# Altium footprint library Library.PcbLib: 292 footprints (part 2 of 20)
Each footprint in its own frame and in the unit in brackets; x right, y up, seen from the top. Pads: shape width x height; smd on the part's side, far side on the other; paste and mask are expansions set on the pad; w line width, h text height; cw(c..) or ccw(c..) is an arc to the next point about the centre after c.
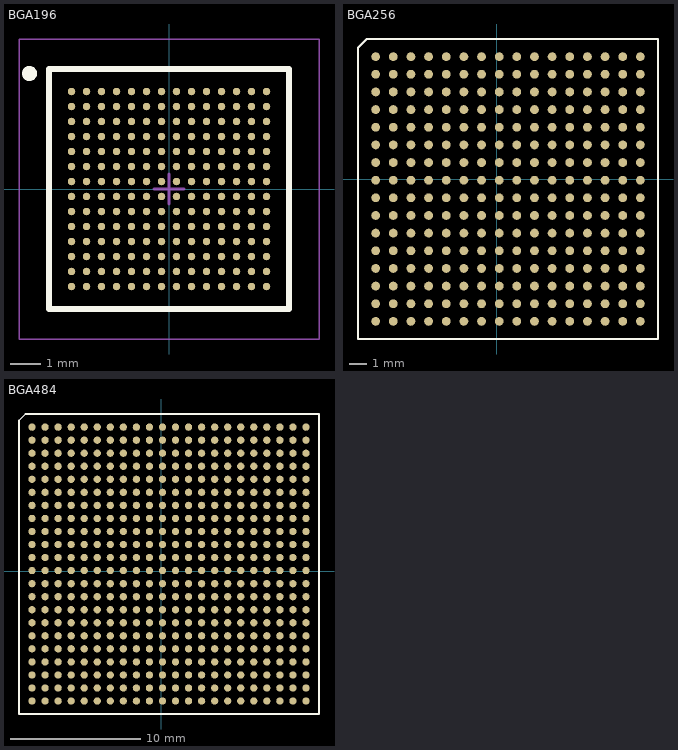
[diagram p1: the footprints below, top view; thin cyan lines are the x and y axes]

## BGA196 [mm] "BGA, 196-Leads, Body 8x8mm, Pitch 0.5mm"
height 1.1
pads (196):
  round 0.25 smd: A1(-3.25,3.25) A2(-2.75,3.25) A3(-2.25,3.25) A4(-1.75,3.25) A5(-1.25,3.25) A6(-0.75,3.25) A7(-0.25,3.25) A8(0.25,3.25) A9(0.75,3.25) A10(1.25,3.25) A11(1.75,3.25) A12(2.25,3.25) A13(2.75,3.25) A14(3.25,3.25) B1(-3.25,2.75) B2(-2.75,2.75) B3(-2.25,2.75) B4(-1.75,2.75) B5(-1.25,2.75) B6(-0.75,2.75) B7(-0.25,2.75) B8(0.25,2.75) B9(0.75,2.75) B10(1.25,2.75) B11(1.75,2.75) B12(2.25,2.75) B13(2.75,2.75) B14(3.25,2.75) C1(-3.25,2.25) C2(-2.75,2.25) C3(-2.25,2.25) C4(-1.75,2.25) C5(-1.25,2.25) C6(-0.75,2.25) C7(-0.25,2.25) C8(0.25,2.25) C9(0.75,2.25) C10(1.25,2.25) C11(1.75,2.25) C12(2.25,2.25) C13(2.75,2.25) C14(3.25,2.25) D1(-3.25,1.75) D2(-2.75,1.75) D3(-2.25,1.75) D4(-1.75,1.75) D5(-1.25,1.75) D6(-0.75,1.75) D7(-0.25,1.75) D8(0.25,1.75) D9(0.75,1.75) D10(1.25,1.75) D11(1.75,1.75) D12(2.25,1.75) D13(2.75,1.75) D14(3.25,1.75) E1(-3.25,1.25) E2(-2.75,1.25) E3(-2.25,1.25) E4(-1.75,1.25) E5(-1.25,1.25) E6(-0.75,1.25) E7(-0.25,1.25) E8(0.25,1.25) E9(0.75,1.25) E10(1.25,1.25) E11(1.75,1.25) E12(2.25,1.25) E13(2.75,1.25) E14(3.25,1.25) F1(-3.25,0.75) F2(-2.75,0.75) F3(-2.25,0.75) F4(-1.75,0.75) F5(-1.25,0.75) F6(-0.75,0.75) F7(-0.25,0.75) F8(0.25,0.75) F9(0.75,0.75) F10(1.25,0.75) F11(1.75,0.75) F12(2.25,0.75) F13(2.75,0.75) F14(3.25,0.75) G1(-3.25,0.25) G2(-2.75,0.25) G3(-2.25,0.25) G4(-1.75,0.25) G5(-1.25,0.25) G6(-0.75,0.25) G7(-0.25,0.25) G8(0.25,0.25) G9(0.75,0.25) G10(1.25,0.25) G11(1.75,0.25) G12(2.25,0.25) G13(2.75,0.25) G14(3.25,0.25) H1(-3.25,-0.25) H2(-2.75,-0.25) H3(-2.25,-0.25) H4(-1.75,-0.25) H5(-1.25,-0.25) H6(-0.75,-0.25) H7(-0.25,-0.25) H8(0.25,-0.25) H9(0.75,-0.25) H10(1.25,-0.25) H11(1.75,-0.25) H12(2.25,-0.25) H13(2.75,-0.25) H14(3.25,-0.25) J1(-3.25,-0.75) J2(-2.75,-0.75) J3(-2.25,-0.75) J4(-1.75,-0.75) J5(-1.25,-0.75) J6(-0.75,-0.75) J7(-0.25,-0.75) J8(0.25,-0.75) J9(0.75,-0.75) J10(1.25,-0.75) J11(1.75,-0.75) J12(2.25,-0.75) J13(2.75,-0.75) J14(3.25,-0.75) K1(-3.25,-1.25) K2(-2.75,-1.25) K3(-2.25,-1.25) K4(-1.75,-1.25) K5(-1.25,-1.25) K6(-0.75,-1.25) K7(-0.25,-1.25) K8(0.25,-1.25) K9(0.75,-1.25) K10(1.25,-1.25) K11(1.75,-1.25) K12(2.25,-1.25) K13(2.75,-1.25) K14(3.25,-1.25) L1(-3.25,-1.75) L2(-2.75,-1.75) L3(-2.25,-1.75) L4(-1.75,-1.75) L5(-1.25,-1.75) L6(-0.75,-1.75) L7(-0.25,-1.75) L8(0.25,-1.75) L9(0.75,-1.75) L10(1.25,-1.75) L11(1.75,-1.75) L12(2.25,-1.75) L13(2.75,-1.75) L14(3.25,-1.75) M1(-3.25,-2.25) M2(-2.75,-2.25) M3(-2.25,-2.25) M4(-1.75,-2.25) M5(-1.25,-2.25) M6(-0.75,-2.25) M7(-0.25,-2.25) M8(0.25,-2.25) M9(0.75,-2.25) M10(1.25,-2.25) M11(1.75,-2.25) M12(2.25,-2.25) M13(2.75,-2.25) M14(3.25,-2.25) N1(-3.25,-2.75) N2(-2.75,-2.75) N3(-2.25,-2.75) N4(-1.75,-2.75) N5(-1.25,-2.75) N6(-0.75,-2.75) N7(-0.25,-2.75) N8(0.25,-2.75) N9(0.75,-2.75) N10(1.25,-2.75) N11(1.75,-2.75) N12(2.25,-2.75) N13(2.75,-2.75) N14(3.25,-2.75) P1(-3.25,-3.25) P2(-2.75,-3.25) P3(-2.25,-3.25) P4(-1.75,-3.25) P5(-1.25,-3.25) P6(-0.75,-3.25) P7(-0.25,-3.25) P8(0.25,-3.25) P9(0.75,-3.25) P10(1.25,-3.25) P11(1.75,-3.25) P12(2.25,-3.25) P13(2.75,-3.25) P14(3.25,-3.25)
Top Overlay:
  circle w0.25: c-4.65,3.85 r0.125
  lines w0.2: -4,-4 4,-4 4,4 -4,4 -4,-4
Mechanical 13:
  lines w0.1: -4,-4 4,-4 4,4 -4,4 -4,-4
Mechanical 15:
  lines w0.05: -5,-5 5,-5 5,5 -5,5 -5,-5
  lines w0.1: -0.5,0 0.5,0 ; 0,-0.5 0,0.5
3D body "BGA196C50P14X14_800X800X150.step": height 1.5, standoff 0, extent -4,-4 4,4

## BGA256 [mm]
pads (256):
  round 0.5 smd: A1(-6.857,6.936) A2(-5.857,6.936) A3(-4.857,6.936) A4(-3.857,6.936) A5(-2.857,6.936) A6(-1.857,6.936) A7(-0.857,6.936) A8(0.143,6.936) A9(1.143,6.936) A10(2.143,6.936) A11(3.143,6.936) A12(4.143,6.936) A13(5.143,6.936) A14(6.143,6.936) A15(7.143,6.936) A16(8.143,6.936) B1(-6.857,5.936) B2(-5.857,5.936) B3(-4.857,5.936) B4(-3.857,5.936) B5(-2.857,5.936) B6(-1.857,5.936) B7(-0.857,5.936) B8(0.143,5.936) B9(1.143,5.936) B10(2.143,5.936) B11(3.143,5.936) B12(4.143,5.936) B13(5.143,5.936) B14(6.143,5.936) B15(7.143,5.936) B16(8.143,5.936) C1(-6.857,4.936) C2(-5.857,4.936) C3(-4.857,4.936) C4(-3.857,4.936) C5(-2.857,4.936) C6(-1.857,4.936) C7(-0.857,4.936) C8(0.143,4.936) C9(1.143,4.936) C10(2.143,4.936) C11(3.143,4.936) C12(4.143,4.936) C13(5.143,4.936) C14(6.143,4.936) C15(7.143,4.936) C16(8.143,4.936) D1(-6.857,3.936) D2(-5.857,3.936) D3(-4.857,3.936) D4(-3.857,3.936) D5(-2.857,3.936) D6(-1.857,3.936) D7(-0.857,3.936) D8(0.143,3.936) D9(1.143,3.936) D10(2.143,3.936) D11(3.143,3.936) D12(4.143,3.936) D13(5.143,3.936) D14(6.143,3.936) D15(7.143,3.936) D16(8.143,3.936) E1(-6.857,2.936) E2(-5.857,2.936) E3(-4.857,2.936) E4(-3.857,2.936) E5(-2.857,2.936) E6(-1.857,2.936) E7(-0.857,2.936) E8(0.143,2.936) E9(1.143,2.936) E10(2.143,2.936) E11(3.143,2.936) E12(4.143,2.936) E13(5.143,2.936) E14(6.143,2.936) E15(7.143,2.936) E16(8.143,2.936) F1(-6.857,1.936) F2(-5.857,1.936) F3(-4.857,1.936) F4(-3.857,1.936) F5(-2.857,1.936) F6(-1.857,1.936) F7(-0.857,1.936) F8(0.143,1.936) F9(1.143,1.936) F10(2.143,1.936) F11(3.143,1.936) F12(4.143,1.936) F13(5.143,1.936) F14(6.143,1.936) F15(7.143,1.936) F16(8.143,1.936) G1(-6.857,0.936) G2(-5.857,0.936) G3(-4.857,0.936) G4(-3.857,0.936) G5(-2.857,0.936) G6(-1.857,0.936) G7(-0.857,0.936) G8(0.143,0.936) G9(1.143,0.936) G10(2.143,0.936) G11(3.143,0.936) G12(4.143,0.936) G13(5.143,0.936) G14(6.143,0.936) G15(7.143,0.936) G16(8.143,0.936) H1(-6.857,-0.064) H2(-5.857,-0.064) H3(-4.857,-0.064) H4(-3.857,-0.064) H5(-2.857,-0.064) H6(-1.857,-0.064) H7(-0.857,-0.064) H8(0.143,-0.064) H9(1.143,-0.064) H10(2.143,-0.064) H11(3.143,-0.064) H12(4.143,-0.064) H13(5.143,-0.064) H14(6.143,-0.064) H15(7.143,-0.064) H16(8.143,-0.064) J1(-6.857,-1.064) J2(-5.857,-1.064) J3(-4.857,-1.064) J4(-3.857,-1.064) J5(-2.857,-1.064) J6(-1.857,-1.064) J7(-0.857,-1.064) J8(0.143,-1.064) J9(1.143,-1.064) J10(2.143,-1.064) J11(3.143,-1.064) J12(4.143,-1.064) J13(5.143,-1.064) J14(6.143,-1.064) J15(7.143,-1.064) J16(8.143,-1.064) K1(-6.857,-2.064) K2(-5.857,-2.064) K3(-4.857,-2.064) K4(-3.857,-2.064) K5(-2.857,-2.064) K6(-1.857,-2.064) K7(-0.857,-2.064) K8(0.143,-2.064) K9(1.143,-2.064) K10(2.143,-2.064) K11(3.143,-2.064) K12(4.143,-2.064) K13(5.143,-2.064) K14(6.143,-2.064) K15(7.143,-2.064) K16(8.143,-2.064) L1(-6.857,-3.064) L2(-5.857,-3.064) L3(-4.857,-3.064) L4(-3.857,-3.064) L5(-2.857,-3.064) L6(-1.857,-3.064) L7(-0.857,-3.064) L8(0.143,-3.064) L9(1.143,-3.064) L10(2.143,-3.064) L11(3.143,-3.064) L12(4.143,-3.064) L13(5.143,-3.064) L14(6.143,-3.064) L15(7.143,-3.064) L16(8.143,-3.064) M1(-6.857,-4.064) M2(-5.857,-4.064) M3(-4.857,-4.064) M4(-3.857,-4.064) M5(-2.857,-4.064) M6(-1.857,-4.064) M7(-0.857,-4.064) M8(0.143,-4.064) M9(1.143,-4.064) M10(2.143,-4.064) M11(3.143,-4.064) M12(4.143,-4.064) M13(5.143,-4.064) M14(6.143,-4.064) M15(7.143,-4.064) M16(8.143,-4.064) N1(-6.857,-5.064) N2(-5.857,-5.064) N3(-4.857,-5.064) N4(-3.857,-5.064) N5(-2.857,-5.064) N6(-1.857,-5.064) N7(-0.857,-5.064) N8(0.143,-5.064) N9(1.143,-5.064) N10(2.143,-5.064) N11(3.143,-5.064) N12(4.143,-5.064) N13(5.143,-5.064) N14(6.143,-5.064) N15(7.143,-5.064) N16(8.143,-5.064) P1(-6.857,-6.064) P2(-5.857,-6.064) P3(-4.857,-6.064) P4(-3.857,-6.064) P5(-2.857,-6.064) P6(-1.857,-6.064) P7(-0.857,-6.064) P8(0.143,-6.064) P9(1.143,-6.064) P10(2.143,-6.064) P11(3.143,-6.064) P12(4.143,-6.064) P13(5.143,-6.064) P14(6.143,-6.064) P15(7.143,-6.064) P16(8.143,-6.064) R1(-6.857,-7.064) R2(-5.857,-7.064) R3(-4.857,-7.064) R4(-3.857,-7.064) R5(-2.857,-7.064) R6(-1.857,-7.064) R7(-0.857,-7.064) R8(0.143,-7.064) R9(1.143,-7.064) R10(2.143,-7.064) R11(3.143,-7.064) R12(4.143,-7.064) R13(5.143,-7.064) R14(6.143,-7.064) R15(7.143,-7.064) R16(8.143,-7.064) T1(-6.857,-8.064) T2(-5.857,-8.064) T3(-4.857,-8.064) T4(-3.857,-8.064) T5(-2.857,-8.064) T6(-1.857,-8.064) T7(-0.857,-8.064) T8(0.143,-8.064) T9(1.143,-8.064) T10(2.143,-8.064) T11(3.143,-8.064) T12(4.143,-8.064) T13(5.143,-8.064) T14(6.143,-8.064) T15(7.143,-8.064) T16(8.143,-8.064)
Top Overlay:
  lines w0.127: -7.857,-9.064 -7.857,7.436 -7.357,7.936 9.143,7.936 9.143,-9.064 -7.857,-9.064
3D body "User Library-BGA 256 17x17mm 1mm pitch.step": height 1.5, standoff -0.25, extent -7.865,-9.017 9.135,7.983

## BGA484 [mil]
pads (484):
  round 22 smd: A1(-390,434.77) A2(-350.63,434.77) A3(-311.26,434.77) A4(-271.89,434.77) A5(-232.52,434.77) A6(-193.15,434.77) A7(-153.78,434.77) A8(-114.41,434.77) A9(-75.04,434.77) A10(-35.67,434.77) A11(3.7,434.77) A12(43.07,434.77) A13(82.44,434.77) A14(121.81,434.77) A15(161.18,434.77) A16(200.55,434.77) A17(239.92,434.77) A18(279.29,434.77) A19(318.66,434.77) A20(358.03,434.77) A21(397.4,434.77) A22(436.77,434.77) AA1(-390,-352.63) AA2(-350.63,-352.63) AA3(-311.26,-352.63) AA4(-271.89,-352.63) AA5(-232.52,-352.63) AA6(-193.15,-352.63) AA7(-153.78,-352.63) AA8(-114.41,-352.63) AA9(-75.04,-352.63) AA10(-35.67,-352.63) AA11(3.7,-352.63) AA12(43.07,-352.63) AA13(82.44,-352.63) AA14(121.81,-352.63) AA15(161.18,-352.63) AA16(200.55,-352.63) AA17(239.92,-352.63) AA18(279.29,-352.63) AA19(318.66,-352.63) AA20(358.03,-352.63) AA21(397.4,-352.63) AA22(436.77,-352.63) AB1(-390,-392) AB2(-350.63,-392) AB3(-311.26,-392) AB4(-271.89,-392) AB5(-232.52,-392) AB6(-193.15,-392) AB7(-153.78,-392) AB8(-114.41,-392) AB9(-75.04,-392) AB10(-35.67,-392) AB11(3.7,-392) AB12(43.07,-392) AB13(82.44,-392) AB14(121.81,-392) AB15(161.18,-392) AB16(200.55,-392) AB17(239.92,-392) AB18(279.29,-392) AB19(318.66,-392) AB20(358.03,-392) AB21(397.4,-392) AB22(436.77,-392) B1(-390,395.4) B2(-350.63,395.4) B3(-311.26,395.4) B4(-271.89,395.4) B5(-232.52,395.4) B6(-193.15,395.4) B7(-153.78,395.4) B8(-114.41,395.4) B9(-75.04,395.4) B10(-35.67,395.4) B11(3.7,395.4) B12(43.07,395.4) B13(82.44,395.4) B14(121.81,395.4) B15(161.18,395.4) B16(200.55,395.4) B17(239.92,395.4) B18(279.29,395.4) B19(318.66,395.4) B20(358.03,395.4) B21(397.4,395.4) B22(436.77,395.4) C1(-390,356.03) C2(-350.63,356.03) C3(-311.26,356.03) C4(-271.89,356.03) C5(-232.52,356.03) C6(-193.15,356.03) C7(-153.78,356.03) C8(-114.41,356.03) C9(-75.04,356.03) C10(-35.67,356.03) C11(3.7,356.03) C12(43.07,356.03) C13(82.44,356.03) C14(121.81,356.03) C15(161.18,356.03) C16(200.55,356.03) C17(239.92,356.03) C18(279.29,356.03) C19(318.66,356.03) C20(358.03,356.03) C21(397.4,356.03) C22(436.77,356.03) D1(-390,316.66) D2(-350.63,316.66) D3(-311.26,316.66) D4(-271.89,316.66) D5(-232.52,316.66) D6(-193.15,316.66) D7(-153.78,316.66) D8(-114.41,316.66) D9(-75.04,316.66) D10(-35.67,316.66) D11(3.7,316.66) D12(43.07,316.66) D13(82.44,316.66) D14(121.81,316.66) D15(161.18,316.66) D16(200.55,316.66) D17(239.92,316.66) D18(279.29,316.66) D19(318.66,316.66) D20(358.03,316.66) D21(397.4,316.66) D22(436.77,316.66) E1(-390,277.29) E2(-350.63,277.29) E3(-311.26,277.29) E4(-271.89,277.29) E5(-232.52,277.29) E6(-193.15,277.29) E7(-153.78,277.29) E8(-114.41,277.29) E9(-75.04,277.29) E10(-35.67,277.29) E11(3.7,277.29) E12(43.07,277.29) E13(82.44,277.29) E14(121.81,277.29) E15(161.18,277.29) E16(200.55,277.29) E17(239.92,277.29) E18(279.29,277.29) E19(318.66,277.29) E20(358.03,277.29) E21(397.4,277.29) E22(436.77,277.29) F1(-390,237.92) F2(-350.63,237.92) F3(-311.26,237.92) F4(-271.89,237.92) F5(-232.52,237.92) F6(-193.15,237.92) F7(-153.78,237.92) F8(-114.41,237.92) F9(-75.04,237.92) F10(-35.67,237.92) F11(3.7,237.92) F12(43.07,237.92) F13(82.44,237.92) F14(121.81,237.92) F15(161.18,237.92) F16(200.55,237.92) F17(239.92,237.92) F18(279.29,237.92) F19(318.66,237.92) F20(358.03,237.92) F21(397.4,237.92) F22(436.77,237.92) G1(-390,198.55) G2(-350.63,198.55) G3(-311.26,198.55) G4(-271.89,198.55) G5(-232.52,198.55) G6(-193.15,198.55) G7(-153.78,198.55) G8(-114.41,198.55) G9(-75.04,198.55) G10(-35.67,198.55) G11(3.7,198.55) G12(43.07,198.55) G13(82.44,198.55) G14(121.81,198.55) G15(161.18,198.55) G16(200.55,198.55) G17(239.92,198.55) G18(279.29,198.55) G19(318.66,198.55) G20(358.03,198.55) G21(397.4,198.55) G22(436.77,198.55) H1(-390,159.18) H2(-350.63,159.18) H3(-311.26,159.18) H4(-271.89,159.18) H5(-232.52,159.18) H6(-193.15,159.18) H7(-153.78,159.18) H8(-114.41,159.18) H9(-75.04,159.18) H10(-35.67,159.18) H11(3.7,159.18) H12(43.07,159.18) H13(82.44,159.18) H14(121.81,159.18) H15(161.18,159.18) H16(200.55,159.18) H17(239.92,159.18) H18(279.29,159.18) H19(318.66,159.18) H20(358.03,159.18) H21(397.4,159.18) H22(436.77,159.18) J1(-390,119.81) J2(-350.63,119.81) J3(-311.26,119.81) J4(-271.89,119.81) J5(-232.52,119.81) J6(-193.15,119.81) J7(-153.78,119.81) J8(-114.41,119.81) J9(-75.04,119.81) J10(-35.67,119.81) J11(3.7,119.81) J12(43.07,119.81) J13(82.44,119.81) J14(121.81,119.81) J15(161.18,119.81) J16(200.55,119.81) J17(239.92,119.81) J18(279.29,119.81) J19(318.66,119.81) J20(358.03,119.81) J21(397.4,119.81) J22(436.77,119.81) K1(-390,80.44) K2(-350.63,80.44) K3(-311.26,80.44) K4(-271.89,80.44) K5(-232.52,80.44) K6(-193.15,80.44) K7(-153.78,80.44) K8(-114.41,80.44) K9(-75.04,80.44) K10(-35.67,80.44) K11(3.7,80.44) K12(43.07,80.44) K13(82.44,80.44) K14(121.81,80.44) K15(161.18,80.44) K16(200.55,80.44) K17(239.92,80.44) K18(279.29,80.44) K19(318.66,80.44) K20(358.03,80.44) K21(397.4,80.44) K22(436.77,80.44) L1(-390,41.07) L2(-350.63,41.07) L3(-311.26,41.07) L4(-271.89,41.07) L5(-232.52,41.07) L6(-193.15,41.07) L7(-153.78,41.07) L8(-114.41,41.07) L9(-75.04,41.07) L10(-35.67,41.07) L11(3.7,41.07) L12(43.07,41.07) L13(82.44,41.07) L14(121.81,41.07) L15(161.18,41.07) L16(200.55,41.07) L17(239.92,41.07) L18(279.29,41.07) L19(318.66,41.07) L20(358.03,41.07) L21(397.4,41.07) L22(436.77,41.07) M1(-390,1.7) M2(-350.63,1.7) M3(-311.26,1.7) M4(-271.89,1.7) M5(-232.52,1.7) M6(-193.15,1.7) M7(-153.78,1.7) M8(-114.41,1.7) M9(-75.04,1.7) M10(-35.67,1.7) M11(3.7,1.7) M12(43.07,1.7) M13(82.44,1.7) M14(121.81,1.7) M15(161.18,1.7) M16(200.55,1.7) M17(239.92,1.7) M18(279.29,1.7) M19(318.66,1.7) M20(358.03,1.7) M21(397.4,1.7) M22(436.77,1.7) N1(-390,-37.67) N2(-350.63,-37.67) N3(-311.26,-37.67) N4(-271.89,-37.67) N5(-232.52,-37.67) N6(-193.15,-37.67) N7(-153.78,-37.67) N8(-114.41,-37.67) N9(-75.04,-37.67) N10(-35.67,-37.67) N11(3.7,-37.67) N12(43.07,-37.67) N13(82.44,-37.67) N14(121.81,-37.67) N15(161.18,-37.67) N16(200.55,-37.67) N17(239.92,-37.67) N18(279.29,-37.67) N19(318.66,-37.67) N20(358.03,-37.67) N21(397.4,-37.67) N22(436.77,-37.67) P1(-390,-77.04) P2(-350.63,-77.04) P3(-311.26,-77.04) P4(-271.89,-77.04) P5(-232.52,-77.04) P6(-193.15,-77.04) P7(-153.78,-77.04) P8(-114.41,-77.04) P9(-75.04,-77.04) P10(-35.67,-77.04) P11(3.7,-77.04) P12(43.07,-77.04) P13(82.44,-77.04) P14(121.81,-77.04) P15(161.18,-77.04) P16(200.55,-77.04) P17(239.92,-77.04) P18(279.29,-77.04) P19(318.66,-77.04) P20(358.03,-77.04) P21(397.4,-77.04) P22(436.77,-77.04) R1(-390,-116.41) R2(-350.63,-116.41) R3(-311.26,-116.41) R4(-271.89,-116.41) R5(-232.52,-116.41) R6(-193.15,-116.41) R7(-153.78,-116.41) R8(-114.41,-116.41) R9(-75.04,-116.41) R10(-35.67,-116.41) R11(3.7,-116.41) R12(43.07,-116.41) R13(82.44,-116.41) R14(121.81,-116.41) R15(161.18,-116.41) R16(200.55,-116.41) R17(239.92,-116.41) R18(279.29,-116.41) R19(318.66,-116.41) R20(358.03,-116.41) R21(397.4,-116.41) R22(436.77,-116.41) T1(-390,-155.78) T2(-350.63,-155.78) T3(-311.26,-155.78) T4(-271.89,-155.78) T5(-232.52,-155.78) T6(-193.15,-155.78) T7(-153.78,-155.78) T8(-114.41,-155.78) T9(-75.04,-155.78) T10(-35.67,-155.78) T11(3.7,-155.78) T12(43.07,-155.78) T13(82.44,-155.78) T14(121.81,-155.78) T15(161.18,-155.78) T16(200.55,-155.78) T17(239.92,-155.78) T18(279.29,-155.78) T19(318.66,-155.78) T20(358.03,-155.78) T21(397.4,-155.78) T22(436.77,-155.78) U1(-390,-195.15) U2(-350.63,-195.15) U3(-311.26,-195.15) U4(-271.89,-195.15) U5(-232.52,-195.15) U6(-193.15,-195.15) U7(-153.78,-195.15) U8(-114.41,-195.15) U9(-75.04,-195.15) U10(-35.67,-195.15) U11(3.7,-195.15) U12(43.07,-195.15) U13(82.44,-195.15) U14(121.81,-195.15) U15(161.18,-195.15) U16(200.55,-195.15) U17(239.92,-195.15) U18(279.29,-195.15) U19(318.66,-195.15) U20(358.03,-195.15) U21(397.4,-195.15) U22(436.77,-195.15) V1(-390,-234.52) V2(-350.63,-234.52) V3(-311.26,-234.52) V4(-271.89,-234.52) V5(-232.52,-234.52) V6(-193.15,-234.52) V7(-153.78,-234.52) V8(-114.41,-234.52) V9(-75.04,-234.52) V10(-35.67,-234.52) V11(3.7,-234.52) V12(43.07,-234.52) V13(82.44,-234.52) V14(121.81,-234.52) V15(161.18,-234.52) V16(200.55,-234.52) V17(239.92,-234.52) V18(279.29,-234.52) V19(318.66,-234.52) V20(358.03,-234.52) V21(397.4,-234.52) V22(436.77,-234.52) W1(-390,-273.89) W2(-350.63,-273.89) W3(-311.26,-273.89) W4(-271.89,-273.89) W5(-232.52,-273.89) W6(-193.15,-273.89) W7(-153.78,-273.89) W8(-114.41,-273.89) W9(-75.04,-273.89) W10(-35.67,-273.89) W11(3.7,-273.89) W12(43.07,-273.89) W13(82.44,-273.89) W14(121.81,-273.89) W15(161.18,-273.89) W16(200.55,-273.89) W17(239.92,-273.89) W18(279.29,-273.89) W19(318.66,-273.89) W20(358.03,-273.89) W21(397.4,-273.89) W22(436.77,-273.89) Y1(-390,-313.26) Y2(-350.63,-313.26) Y3(-311.26,-313.26) Y4(-271.89,-313.26) Y5(-232.52,-313.26) Y6(-193.15,-313.26) Y7(-153.78,-313.26) Y8(-114.41,-313.26) Y9(-75.04,-313.26) Y10(-35.67,-313.26) Y11(3.7,-313.26) Y12(43.07,-313.26) Y13(82.44,-313.26) Y14(121.81,-313.26) Y15(161.18,-313.26) Y16(200.55,-313.26) Y17(239.92,-313.26) Y18(279.29,-313.26) Y19(318.66,-313.26) Y20(358.03,-313.26) Y21(397.4,-313.26) Y22(436.77,-313.26)
Top Overlay:
  lines w5: -429.37,-431.14 476.14,-431.14 476.14,474.37 -409.69,474.37 -429.37,454.69 -429.37,-431.14
3D body: height 22, standoff -2, extent -402,-365 -378.13,-341.1
3D body: height 22, standoff -2, extent -363,-365 -339.13,-341.1
3D body: height 22, standoff -2, extent -323,-365 -299.13,-341.1
3D body: height 22, standoff -2, extent -284,-365 -260.13,-341.1
3D body: height 22, standoff -2, extent -284,-404 -260.13,-380.1
3D body: height 22, standoff -2, extent -323,-404 -299.13,-380.1
3D body: height 22, standoff -2, extent -363,-404 -339.13,-380.1
3D body: height 22, standoff -2, extent -402,-404 -378.13,-380.1
3D body: height 22, standoff -2, extent -244,-404 -220.13,-380.1
3D body: height 22, standoff -2, extent -205,-404 -181.13,-380.1
3D body: height 22, standoff -2, extent -165,-404 -141.13,-380.1
3D body: height 22, standoff -2, extent -126,-404 -102.13,-380.1
3D body: height 22, standoff -2, extent -126,-365 -102.13,-341.1
3D body: height 22, standoff -2, extent -165,-365 -141.13,-341.1
3D body: height 22, standoff -2, extent -205,-365 -181.13,-341.1
3D body: height 22, standoff -2, extent -244,-365 -220.13,-341.1
3D body: height 22, standoff -2, extent -88,-404 -64.13,-380.1
3D body: height 22, standoff -2, extent -49,-404 -25.13,-380.1
3D body: height 22, standoff -2, extent -9,-404 14.87,-380.1
3D body: height 22, standoff -2, extent 30,-404 53.87,-380.1
3D body: height 22, standoff -2, extent 30,-365 53.87,-341.1
3D body: height 22, standoff -2, extent -9,-365 14.87,-341.1
3D body: height 22, standoff -2, extent -49,-365 -25.13,-341.1
3D body: height 22, standoff -2, extent -88,-365 -64.13,-341.1
3D body: height 22, standoff -2, extent 70,-404 93.87,-380.1
3D body: height 22, standoff -2, extent 109,-404 132.87,-380.1
3D body: height 22, standoff -2, extent 149,-404 172.87,-380.1
3D body: height 22, standoff -2, extent 188,-404 211.87,-380.1
3D body: height 22, standoff -2, extent 188,-365 211.87,-341.1
3D body: height 22, standoff -2, extent 149,-365 172.87,-341.1
3D body: height 22, standoff -2, extent 109,-365 132.87,-341.1
3D body: height 22, standoff -2, extent 70,-365 93.87,-341.1
3D body: height 22, standoff -2, extent 227,-403 250.87,-379.1
3D body: height 22, standoff -2, extent 266,-403 289.87,-379.1
3D body: height 22, standoff -2, extent 306,-403 329.87,-379.1
3D body: height 22, standoff -2, extent 345,-403 368.87,-379.1
3D body: height 22, standoff -2, extent 345,-364 368.87,-340.1
3D body: height 22, standoff -2, extent 306,-364 329.87,-340.1
3D body: height 22, standoff -2, extent 266,-364 289.87,-340.1
3D body: height 22, standoff -2, extent 227,-364 250.87,-340.1
3D body: height 22, standoff -2, extent 386,-404 409.87,-380.1
3D body: height 22, standoff -2, extent 425,-404 448.87,-380.1
3D body: height 22, standoff -2, extent 425,-365 448.87,-341.1
3D body: height 22, standoff -2, extent 386,-365 409.87,-341.1
3D body: height 22, standoff -2, extent 386,-286 409.87,-262.1
3D body: height 22, standoff -2, extent 425,-286 448.87,-262.1
3D body: height 22, standoff -2, extent 425,-325 448.87,-301.1
3D body: height 22, standoff -2, extent 386,-325 409.87,-301.1
3D body: height 22, standoff -2, extent 227,-285 250.87,-261.1
3D body: height 22, standoff -2, extent 266,-285 289.87,-261.1
3D body: height 22, standoff -2, extent 306,-285 329.87,-261.1
3D body: height 22, standoff -2, extent 345,-285 368.87,-261.1
3D body: height 22, standoff -2, extent 345,-324 368.87,-300.1
3D body: height 22, standoff -2, extent 306,-324 329.87,-300.1
3D body: height 22, standoff -2, extent 266,-324 289.87,-300.1
3D body: height 22, standoff -2, extent 227,-324 250.87,-300.1
3D body: height 22, standoff -2, extent 70,-286 93.87,-262.1
3D body: height 22, standoff -2, extent 109,-286 132.87,-262.1
3D body: height 22, standoff -2, extent 149,-286 172.87,-262.1
3D body: height 22, standoff -2, extent 188,-286 211.87,-262.1
3D body: height 22, standoff -2, extent 188,-325 211.87,-301.1
3D body: height 22, standoff -2, extent 149,-325 172.87,-301.1
3D body: height 22, standoff -2, extent 109,-325 132.87,-301.1
3D body: height 22, standoff -2, extent 70,-325 93.87,-301.1
3D body: height 22, standoff -2, extent -88,-286 -64.13,-262.1
3D body: height 22, standoff -2, extent -49,-286 -25.13,-262.1
3D body: height 22, standoff -2, extent -9,-286 14.87,-262.1
3D body: height 22, standoff -2, extent 30,-286 53.87,-262.1
3D body: height 22, standoff -2, extent 30,-325 53.87,-301.1
3D body: height 22, standoff -2, extent -9,-325 14.87,-301.1
3D body: height 22, standoff -2, extent -49,-325 -25.13,-301.1
3D body: height 22, standoff -2, extent -88,-325 -64.13,-301.1
3D body: height 22, standoff -2, extent -244,-286 -220.13,-262.1
3D body: height 22, standoff -2, extent -205,-286 -181.13,-262.1
3D body: height 22, standoff -2, extent -165,-286 -141.13,-262.1
3D body: height 22, standoff -2, extent -126,-286 -102.13,-262.1
3D body: height 22, standoff -2, extent -126,-325 -102.13,-301.1
3D body: height 22, standoff -2, extent -165,-325 -141.13,-301.1
3D body: height 22, standoff -2, extent -205,-325 -181.13,-301.1
3D body: height 22, standoff -2, extent -244,-325 -220.13,-301.1
3D body: height 22, standoff -2, extent -402,-325 -378.13,-301.1
3D body: height 22, standoff -2, extent -363,-325 -339.13,-301.1
3D body: height 22, standoff -2, extent -323,-325 -299.13,-301.1
3D body: height 22, standoff -2, extent -284,-325 -260.13,-301.1
3D body: height 22, standoff -2, extent -284,-286 -260.13,-262.1
3D body: height 22, standoff -2, extent -323,-286 -299.13,-262.1
3D body: height 22, standoff -2, extent -363,-286 -339.13,-262.1
3D body: height 22, standoff -2, extent -402,-286 -378.13,-262.1
3D body: height 22, standoff -2, extent -402,-128 -378.13,-104.1
3D body: height 22, standoff -2, extent -363,-128 -339.13,-104.1
3D body: height 22, standoff -2, extent -323,-128 -299.13,-104.1
3D body: height 22, standoff -2, extent -284,-128 -260.13,-104.1
3D body: height 22, standoff -2, extent -284,-167 -260.13,-143.1
3D body: height 22, standoff -2, extent -323,-167 -299.13,-143.1
3D body: height 22, standoff -2, extent -363,-167 -339.13,-143.1
3D body: height 22, standoff -2, extent -402,-167 -378.13,-143.1
3D body: height 22, standoff -2, extent -244,-167 -220.13,-143.1
3D body: height 22, standoff -2, extent -205,-167 -181.13,-143.1
3D body: height 22, standoff -2, extent -165,-167 -141.13,-143.1
3D body: height 22, standoff -2, extent -126,-167 -102.13,-143.1
3D body: height 22, standoff -2, extent -126,-128 -102.13,-104.1
3D body: height 22, standoff -2, extent -165,-128 -141.13,-104.1
3D body: height 22, standoff -2, extent -205,-128 -181.13,-104.1
3D body: height 22, standoff -2, extent -244,-128 -220.13,-104.1
3D body: height 22, standoff -2, extent -88,-167 -64.13,-143.1
3D body: height 22, standoff -2, extent -49,-167 -25.13,-143.1
3D body: height 22, standoff -2, extent -9,-167 14.87,-143.1
3D body: height 22, standoff -2, extent 30,-167 53.87,-143.1
3D body: height 22, standoff -2, extent 30,-128 53.87,-104.1
3D body: height 22, standoff -2, extent -9,-128 14.87,-104.1
3D body: height 22, standoff -2, extent -49,-128 -25.13,-104.1
3D body: height 22, standoff -2, extent -88,-128 -64.13,-104.1
3D body: height 22, standoff -2, extent 70,-167 93.87,-143.1
3D body: height 22, standoff -2, extent 109,-167 132.87,-143.1
3D body: height 22, standoff -2, extent 149,-167 172.87,-143.1
3D body: height 22, standoff -2, extent 188,-167 211.87,-143.1
3D body: height 22, standoff -2, extent 188,-128 211.87,-104.1
3D body: height 22, standoff -2, extent 149,-128 172.87,-104.1
3D body: height 22, standoff -2, extent 109,-128 132.87,-104.1
3D body: height 22, standoff -2, extent 70,-128 93.87,-104.1
3D body: height 22, standoff -2, extent 227,-166 250.87,-142.1
3D body: height 22, standoff -2, extent 266,-166 289.87,-142.1
3D body: height 22, standoff -2, extent 306,-166 329.87,-142.1
3D body: height 22, standoff -2, extent 345,-166 368.87,-142.1
3D body: height 22, standoff -2, extent 345,-127 368.87,-103.1
3D body: height 22, standoff -2, extent 306,-127 329.87,-103.1
3D body: height 22, standoff -2, extent 266,-127 289.87,-103.1
3D body: height 22, standoff -2, extent 227,-127 250.87,-103.1
3D body: height 22, standoff -2, extent 386,-167 409.87,-143.1
3D body: height 22, standoff -2, extent 425,-167 448.87,-143.1
3D body: height 22, standoff -2, extent 425,-128 448.87,-104.1
3D body: height 22, standoff -2, extent 386,-128 409.87,-104.1
3D body: height 22, standoff -2, extent 386,-207 409.87,-183.1
3D body: height 22, standoff -2, extent 425,-207 448.87,-183.1
3D body: height 22, standoff -2, extent 425,-246 448.87,-222.1
3D body: height 22, standoff -2, extent 386,-246 409.87,-222.1
3D body: height 22, standoff -2, extent 227,-206 250.87,-182.1
3D body: height 22, standoff -2, extent 266,-206 289.87,-182.1
3D body: height 22, standoff -2, extent 306,-206 329.87,-182.1
3D body: height 22, standoff -2, extent 345,-206 368.87,-182.1
3D body: height 22, standoff -2, extent 345,-245 368.87,-221.1
3D body: height 22, standoff -2, extent 306,-245 329.87,-221.1
3D body: height 22, standoff -2, extent 266,-245 289.87,-221.1
3D body: height 22, standoff -2, extent 227,-245 250.87,-221.1
3D body: height 22, standoff -2, extent 70,-207 93.87,-183.1
3D body: height 22, standoff -2, extent 109,-207 132.87,-183.1
3D body: height 22, standoff -2, extent 149,-207 172.87,-183.1
3D body: height 22, standoff -2, extent 188,-207 211.87,-183.1
3D body: height 22, standoff -2, extent 188,-246 211.87,-222.1
3D body: height 22, standoff -2, extent 149,-246 172.87,-222.1
3D body: height 22, standoff -2, extent 109,-246 132.87,-222.1
3D body: height 22, standoff -2, extent 70,-246 93.87,-222.1
3D body: height 22, standoff -2, extent -88,-207 -64.13,-183.1
3D body: height 22, standoff -2, extent -49,-207 -25.13,-183.1
3D body: height 22, standoff -2, extent -9,-207 14.87,-183.1
3D body: height 22, standoff -2, extent 30,-207 53.87,-183.1
3D body: height 22, standoff -2, extent 30,-246 53.87,-222.1
3D body: height 22, standoff -2, extent -9,-246 14.87,-222.1
3D body: height 22, standoff -2, extent -49,-246 -25.13,-222.1
3D body: height 22, standoff -2, extent -88,-246 -64.13,-222.1
3D body: height 22, standoff -2, extent -244,-207 -220.13,-183.1
3D body: height 22, standoff -2, extent -205,-207 -181.13,-183.1
3D body: height 22, standoff -2, extent -165,-207 -141.13,-183.1
3D body: height 22, standoff -2, extent -126,-207 -102.13,-183.1
3D body: height 22, standoff -2, extent -126,-246 -102.13,-222.1
3D body: height 22, standoff -2, extent -165,-246 -141.13,-222.1
3D body: height 22, standoff -2, extent -205,-246 -181.13,-222.1
3D body: height 22, standoff -2, extent -244,-246 -220.13,-222.1
3D body: height 22, standoff -2, extent -402,-246 -378.13,-222.1
3D body: height 22, standoff -2, extent -363,-246 -339.13,-222.1
3D body: height 22, standoff -2, extent -323,-246 -299.13,-222.1
3D body: height 22, standoff -2, extent -284,-246 -260.13,-222.1
3D body: height 22, standoff -2, extent -284,-207 -260.13,-183.1
3D body: height 22, standoff -2, extent -323,-207 -299.13,-183.1
3D body: height 22, standoff -2, extent -363,-207 -339.13,-183.1
3D body: height 22, standoff -2, extent -402,-207 -378.13,-183.1
3D body: height 22, standoff -2, extent -402,29 -378.13,52.9
3D body: height 22, standoff -2, extent -363,29 -339.13,52.9
3D body: height 22, standoff -2, extent -323,29 -299.13,52.9
3D body: height 22, standoff -2, extent -284,29 -260.13,52.9
3D body: height 22, standoff -2, extent -284,-10 -260.13,13.9
3D body: height 22, standoff -2, extent -323,-10 -299.13,13.9
3D body: height 22, standoff -2, extent -363,-10 -339.13,13.9
3D body: height 22, standoff -2, extent -402,-10 -378.13,13.9
3D body: height 22, standoff -2, extent -244,-10 -220.13,13.9
3D body: height 22, standoff -2, extent -205,-10 -181.13,13.9
3D body: height 22, standoff -2, extent -165,-10 -141.13,13.9
3D body: height 22, standoff -2, extent -126,-10 -102.13,13.9
3D body: height 22, standoff -2, extent -126,29 -102.13,52.9
3D body: height 22, standoff -2, extent -165,29 -141.13,52.9
3D body: height 22, standoff -2, extent -205,29 -181.13,52.9
3D body: height 22, standoff -2, extent -244,29 -220.13,52.9
3D body: height 22, standoff -2, extent -88,-10 -64.13,13.9
3D body: height 22, standoff -2, extent -49,-10 -25.13,13.9
3D body: height 22, standoff -2, extent -9,-10 14.87,13.9
3D body: height 22, standoff -2, extent 30,-10 53.87,13.9
3D body: height 22, standoff -2, extent 30,29 53.87,52.9
3D body: height 22, standoff -2, extent -9,29 14.87,52.9
3D body: height 22, standoff -2, extent -49,29 -25.13,52.9
3D body: height 22, standoff -2, extent -88,29 -64.13,52.9
3D body: height 22, standoff -2, extent 70,-10 93.87,13.9
3D body: height 22, standoff -2, extent 109,-10 132.87,13.9
3D body: height 22, standoff -2, extent 149,-10 172.87,13.9
3D body: height 22, standoff -2, extent 188,-10 211.87,13.9
3D body: height 22, standoff -2, extent 188,29 211.87,52.9
3D body: height 22, standoff -2, extent 149,29 172.87,52.9
3D body: height 22, standoff -2, extent 109,29 132.87,52.9
3D body: height 22, standoff -2, extent 70,29 93.87,52.9
3D body: height 22, standoff -2, extent 227,-9 250.87,14.9
3D body: height 22, standoff -2, extent 266,-9 289.87,14.9
3D body: height 22, standoff -2, extent 306,-9 329.87,14.9
3D body: height 22, standoff -2, extent 345,-9 368.87,14.9
3D body: height 22, standoff -2, extent 345,30 368.87,53.9
3D body: height 22, standoff -2, extent 306,30 329.87,53.9
3D body: height 22, standoff -2, extent 266,30 289.87,53.9
3D body: height 22, standoff -2, extent 227,30 250.87,53.9
3D body: height 22, standoff -2, extent 386,-10 409.87,13.9
3D body: height 22, standoff -2, extent 425,-10 448.87,13.9
3D body: height 22, standoff -2, extent 425,29 448.87,52.9
3D body: height 22, standoff -2, extent 386,29 409.87,52.9
3D body: height 22, standoff -2, extent 386,-50 409.87,-26.1
3D body: height 22, standoff -2, extent 425,-50 448.87,-26.1
3D body: height 22, standoff -2, extent 425,-89 448.87,-65.1
3D body: height 22, standoff -2, extent 386,-89 409.87,-65.1
3D body: height 22, standoff -2, extent 227,-49 250.87,-25.1
3D body: height 22, standoff -2, extent 266,-49 289.87,-25.1
3D body: height 22, standoff -2, extent 306,-49 329.87,-25.1
3D body: height 22, standoff -2, extent 345,-49 368.87,-25.1
3D body: height 22, standoff -2, extent 345,-88 368.87,-64.1
3D body: height 22, standoff -2, extent 306,-88 329.87,-64.1
3D body: height 22, standoff -2, extent 266,-88 289.87,-64.1
3D body: height 22, standoff -2, extent 227,-88 250.87,-64.1
3D body: height 22, standoff -2, extent 70,-50 93.87,-26.1
3D body: height 22, standoff -2, extent 109,-50 132.87,-26.1
3D body: height 22, standoff -2, extent 149,-50 172.87,-26.1
3D body: height 22, standoff -2, extent 188,-50 211.87,-26.1
3D body: height 22, standoff -2, extent 188,-89 211.87,-65.1
3D body: height 22, standoff -2, extent 149,-89 172.87,-65.1
3D body: height 22, standoff -2, extent 109,-89 132.87,-65.1
3D body: height 22, standoff -2, extent 70,-89 93.87,-65.1
3D body: height 22, standoff -2, extent -88,-50 -64.13,-26.1
3D body: height 22, standoff -2, extent -49,-50 -25.13,-26.1
3D body: height 22, standoff -2, extent -9,-50 14.87,-26.1
3D body: height 22, standoff -2, extent 30,-50 53.87,-26.1
3D body: height 22, standoff -2, extent 30,-89 53.87,-65.1
3D body: height 22, standoff -2, extent -9,-89 14.87,-65.1
3D body: height 22, standoff -2, extent -49,-89 -25.13,-65.1
3D body: height 22, standoff -2, extent -88,-89 -64.13,-65.1
3D body: height 22, standoff -2, extent -244,-50 -220.13,-26.1
3D body: height 22, standoff -2, extent -205,-50 -181.13,-26.1
3D body: height 22, standoff -2, extent -165,-50 -141.13,-26.1
3D body: height 22, standoff -2, extent -126,-50 -102.13,-26.1
3D body: height 22, standoff -2, extent -126,-89 -102.13,-65.1
3D body: height 22, standoff -2, extent -165,-89 -141.13,-65.1
3D body: height 22, standoff -2, extent -205,-89 -181.13,-65.1
3D body: height 22, standoff -2, extent -244,-89 -220.13,-65.1
3D body: height 22, standoff -2, extent -402,-89 -378.13,-65.1
3D body: height 22, standoff -2, extent -363,-89 -339.13,-65.1
3D body: height 22, standoff -2, extent -323,-89 -299.13,-65.1
3D body: height 22, standoff -2, extent -284,-89 -260.13,-65.1
3D body: height 22, standoff -2, extent -284,-50 -260.13,-26.1
3D body: height 22, standoff -2, extent -323,-50 -299.13,-26.1
3D body: height 22, standoff -2, extent -363,-50 -339.13,-26.1
3D body: height 22, standoff -2, extent -402,-50 -378.13,-26.1
3D body: height 22, standoff -2, extent -402,187 -378.13,210.9
3D body: height 22, standoff -2, extent -363,187 -339.13,210.9
3D body: height 22, standoff -2, extent -323,187 -299.13,210.9
3D body: height 22, standoff -2, extent -284,187 -260.13,210.9
3D body: height 22, standoff -2, extent -284,148 -260.13,171.9
3D body: height 22, standoff -2, extent -323,148 -299.13,171.9
3D body: height 22, standoff -2, extent -363,148 -339.13,171.9
3D body: height 22, standoff -2, extent -402,148 -378.13,171.9
3D body: height 22, standoff -2, extent -244,148 -220.13,171.9
3D body: height 22, standoff -2, extent -205,148 -181.13,171.9
3D body: height 22, standoff -2, extent -165,148 -141.13,171.9
3D body: height 22, standoff -2, extent -126,148 -102.13,171.9
3D body: height 22, standoff -2, extent -126,187 -102.13,210.9
3D body: height 22, standoff -2, extent -165,187 -141.13,210.9
3D body: height 22, standoff -2, extent -205,187 -181.13,210.9
3D body: height 22, standoff -2, extent -244,187 -220.13,210.9
3D body: height 22, standoff -2, extent -88,148 -64.13,171.9
3D body: height 22, standoff -2, extent -49,148 -25.13,171.9
3D body: height 22, standoff -2, extent -9,148 14.87,171.9
3D body: height 22, standoff -2, extent 30,148 53.87,171.9
3D body: height 22, standoff -2, extent 30,187 53.87,210.9
3D body: height 22, standoff -2, extent -9,187 14.87,210.9
3D body: height 22, standoff -2, extent -49,187 -25.13,210.9
3D body: height 22, standoff -2, extent -88,187 -64.13,210.9
3D body: height 22, standoff -2, extent 70,148 93.87,171.9
3D body: height 22, standoff -2, extent 109,148 132.87,171.9
3D body: height 22, standoff -2, extent 149,148 172.87,171.9
3D body: height 22, standoff -2, extent 188,148 211.87,171.9
3D body: height 22, standoff -2, extent 188,187 211.87,210.9
3D body: height 22, standoff -2, extent 149,187 172.87,210.9
3D body: height 22, standoff -2, extent 109,187 132.87,210.9
3D body: height 22, standoff -2, extent 70,187 93.87,210.9
3D body: height 22, standoff -2, extent 227,149 250.87,172.9
3D body: height 22, standoff -2, extent 266,149 289.87,172.9
3D body: height 22, standoff -2, extent 306,149 329.87,172.9
3D body: height 22, standoff -2, extent 345,149 368.87,172.9
3D body: height 22, standoff -2, extent 345,188 368.87,211.9
3D body: height 22, standoff -2, extent 306,188 329.87,211.9
3D body: height 22, standoff -2, extent 266,188 289.87,211.9
3D body: height 22, standoff -2, extent 227,188 250.87,211.9
3D body: height 22, standoff -2, extent 386,148 409.87,171.9
3D body: height 22, standoff -2, extent 425,148 448.87,171.9
3D body: height 22, standoff -2, extent 425,187 448.87,210.9
3D body: height 22, standoff -2, extent 386,187 409.87,210.9
3D body: height 22, standoff -2, extent 386,108 409.87,131.9
3D body: height 22, standoff -2, extent 425,108 448.87,131.9
3D body: height 22, standoff -2, extent 425,69 448.87,92.9
3D body: height 22, standoff -2, extent 386,69 409.87,92.9
3D body: height 22, standoff -2, extent 227,109 250.87,132.9
3D body: height 22, standoff -2, extent 266,109 289.87,132.9
3D body: height 22, standoff -2, extent 306,109 329.87,132.9
3D body: height 22, standoff -2, extent 345,109 368.87,132.9
3D body: height 22, standoff -2, extent 345,70 368.87,93.9
3D body: height 22, standoff -2, extent 306,70 329.87,93.9
3D body: height 22, standoff -2, extent 266,70 289.87,93.9
3D body: height 22, standoff -2, extent 227,70 250.87,93.9
3D body: height 22, standoff -2, extent 70,108 93.87,131.9
3D body: height 22, standoff -2, extent 109,108 132.87,131.9
3D body: height 22, standoff -2, extent 149,108 172.87,131.9
3D body: height 22, standoff -2, extent 188,108 211.87,131.9
3D body: height 22, standoff -2, extent 188,69 211.87,92.9
3D body: height 22, standoff -2, extent 149,69 172.87,92.9
3D body: height 22, standoff -2, extent 109,69 132.87,92.9
3D body: height 22, standoff -2, extent 70,69 93.87,92.9
3D body: height 22, standoff -2, extent -88,108 -64.13,131.9
3D body: height 22, standoff -2, extent -49,108 -25.13,131.9
3D body: height 22, standoff -2, extent -9,108 14.87,131.9
3D body: height 22, standoff -2, extent 30,108 53.87,131.9
3D body: height 22, standoff -2, extent 30,69 53.87,92.9
3D body: height 22, standoff -2, extent -9,69 14.87,92.9
3D body: height 22, standoff -2, extent -49,69 -25.13,92.9
3D body: height 22, standoff -2, extent -88,69 -64.13,92.9
3D body: height 22, standoff -2, extent -244,108 -220.13,131.9
3D body: height 22, standoff -2, extent -205,108 -181.13,131.9
3D body: height 22, standoff -2, extent -165,108 -141.13,131.9
3D body: height 22, standoff -2, extent -126,108 -102.13,131.9
3D body: height 22, standoff -2, extent -126,69 -102.13,92.9
3D body: height 22, standoff -2, extent -165,69 -141.13,92.9
3D body: height 22, standoff -2, extent -205,69 -181.13,92.9
3D body: height 22, standoff -2, extent -244,69 -220.13,92.9
3D body: height 22, standoff -2, extent -402,69 -378.13,92.9
3D body: height 22, standoff -2, extent -363,69 -339.13,92.9
3D body: height 22, standoff -2, extent -323,69 -299.13,92.9
3D body: height 22, standoff -2, extent -284,69 -260.13,92.9
3D body: height 22, standoff -2, extent -284,108 -260.13,131.9
3D body: height 22, standoff -2, extent -323,108 -299.13,131.9
3D body: height 22, standoff -2, extent -363,108 -339.13,131.9
3D body: height 22, standoff -2, extent -402,108 -378.13,131.9
3D body: height 22, standoff -2, extent -402,344 -378.13,367.9
3D body: height 22, standoff -2, extent -363,344 -339.13,367.9
3D body: height 22, standoff -2, extent -323,344 -299.13,367.9
3D body: height 22, standoff -2, extent -284,344 -260.13,367.9
3D body: height 22, standoff -2, extent -284,305 -260.13,328.9
3D body: height 22, standoff -2, extent -323,305 -299.13,328.9
3D body: height 22, standoff -2, extent -363,305 -339.13,328.9
3D body: height 22, standoff -2, extent -402,305 -378.13,328.9
3D body: height 22, standoff -2, extent -244,305 -220.13,328.9
3D body: height 22, standoff -2, extent -205,305 -181.13,328.9
3D body: height 22, standoff -2, extent -165,305 -141.13,328.9
3D body: height 22, standoff -2, extent -126,305 -102.13,328.9
3D body: height 22, standoff -2, extent -126,344 -102.13,367.9
3D body: height 22, standoff -2, extent -165,344 -141.13,367.9
3D body: height 22, standoff -2, extent -205,344 -181.13,367.9
3D body: height 22, standoff -2, extent -244,344 -220.13,367.9
3D body: height 22, standoff -2, extent -88,305 -64.13,328.9
3D body: height 22, standoff -2, extent -49,305 -25.13,328.9
3D body: height 22, standoff -2, extent -9,305 14.87,328.9
3D body: height 22, standoff -2, extent 30,305 53.87,328.9
3D body: height 22, standoff -2, extent 30,344 53.87,367.9
3D body: height 22, standoff -2, extent -9,344 14.87,367.9
3D body: height 22, standoff -2, extent -49,344 -25.13,367.9
3D body: height 22, standoff -2, extent -88,344 -64.13,367.9
3D body: height 22, standoff -2, extent 70,305 93.87,328.9
3D body: height 22, standoff -2, extent 109,305 132.87,328.9
3D body: height 22, standoff -2, extent 149,305 172.87,328.9
3D body: height 22, standoff -2, extent 188,305 211.87,328.9
3D body: height 22, standoff -2, extent 188,344 211.87,367.9
3D body: height 22, standoff -2, extent 149,344 172.87,367.9
3D body: height 22, standoff -2, extent 109,344 132.87,367.9
3D body: height 22, standoff -2, extent 70,344 93.87,367.9
3D body: height 22, standoff -2, extent 227,306 250.87,329.9
3D body: height 22, standoff -2, extent 266,306 289.87,329.9
3D body: height 22, standoff -2, extent 306,306 329.87,329.9
3D body: height 22, standoff -2, extent 345,306 368.87,329.9
3D body: height 22, standoff -2, extent 345,345 368.87,368.9
3D body: height 22, standoff -2, extent 306,345 329.87,368.9
3D body: height 22, standoff -2, extent 266,345 289.87,368.9
3D body: height 22, standoff -2, extent 227,345 250.87,368.9
3D body: height 22, standoff -2, extent 386,305 409.87,328.9
3D body: height 22, standoff -2, extent 425,305 448.87,328.9
3D body: height 22, standoff -2, extent 425,344 448.87,367.9
3D body: height 22, standoff -2, extent 386,344 409.87,367.9
3D body: height 22, standoff -2, extent 386,265 409.87,288.9
3D body: height 22, standoff -2, extent 425,265 448.87,288.9
3D body: height 22, standoff -2, extent 425,226 448.87,249.9
3D body: height 22, standoff -2, extent 386,226 409.87,249.9
3D body: height 22, standoff -2, extent 227,266 250.87,289.9
3D body: height 22, standoff -2, extent 266,266 289.87,289.9
3D body: height 22, standoff -2, extent 306,266 329.87,289.9
3D body: height 22, standoff -2, extent 345,266 368.87,289.9
3D body: height 22, standoff -2, extent 345,227 368.87,250.9
3D body: height 22, standoff -2, extent 306,227 329.87,250.9
3D body: height 22, standoff -2, extent 266,227 289.87,250.9
3D body: height 22, standoff -2, extent 227,227 250.87,250.9
3D body: height 22, standoff -2, extent 70,265 93.87,288.9
3D body: height 22, standoff -2, extent 109,265 132.87,288.9
3D body: height 22, standoff -2, extent 149,265 172.87,288.9
3D body: height 22, standoff -2, extent 188,265 211.87,288.9
3D body: height 22, standoff -2, extent 188,226 211.87,249.9
3D body: height 22, standoff -2, extent 149,226 172.87,249.9
3D body: height 22, standoff -2, extent 109,226 132.87,249.9
3D body: height 22, standoff -2, extent 70,226 93.87,249.9
3D body: height 22, standoff -2, extent -88,265 -64.13,288.9
3D body: height 22, standoff -2, extent -49,265 -25.13,288.9
3D body: height 22, standoff -2, extent -9,265 14.87,288.9
3D body: height 22, standoff -2, extent 30,265 53.87,288.9
3D body: height 22, standoff -2, extent 30,226 53.87,249.9
3D body: height 22, standoff -2, extent -9,226 14.87,249.9
3D body: height 22, standoff -2, extent -49,226 -25.13,249.9
3D body: height 22, standoff -2, extent -88,226 -64.13,249.9
3D body: height 22, standoff -2, extent -244,265 -220.13,288.9
3D body: height 22, standoff -2, extent -205,265 -181.13,288.9
3D body: height 22, standoff -2, extent -165,265 -141.13,288.9
3D body: height 22, standoff -2, extent -126,265 -102.13,288.9
3D body: height 22, standoff -2, extent -126,226 -102.13,249.9
3D body: height 22, standoff -2, extent -165,226 -141.13,249.9
3D body: height 22, standoff -2, extent -205,226 -181.13,249.9
3D body: height 22, standoff -2, extent -244,226 -220.13,249.9
3D body: height 22, standoff -2, extent -402,226 -378.13,249.9
3D body: height 22, standoff -2, extent -363,226 -339.13,249.9
3D body: height 22, standoff -2, extent -323,226 -299.13,249.9
3D body: height 22, standoff -2, extent -284,226 -260.13,249.9
3D body: height 22, standoff -2, extent -284,265 -260.13,288.9
3D body: height 22, standoff -2, extent -323,265 -299.13,288.9
3D body: height 22, standoff -2, extent -363,265 -339.13,288.9
3D body: height 22, standoff -2, extent -402,265 -378.13,288.9
3D body: height 22, standoff -2, extent 387,422 410.87,445.9
3D body: height 22, standoff -2, extent 426,422 449.87,445.9
3D body: height 22, standoff -2, extent 426,383 449.87,406.9
3D body: height 22, standoff -2, extent 387,383 410.87,406.9
3D body: height 22, standoff -2, extent 228,423 251.87,446.9
3D body: height 22, standoff -2, extent 267,423 290.87,446.9
3D body: height 22, standoff -2, extent 307,423 330.87,446.9
3D body: height 22, standoff -2, extent 346,423 369.87,446.9
3D body: height 22, standoff -2, extent 346,384 369.87,407.9
3D body: height 22, standoff -2, extent 307,384 330.87,407.9
3D body: height 22, standoff -2, extent 267,384 290.87,407.9
3D body: height 22, standoff -2, extent 228,384 251.87,407.9
3D body: height 22, standoff -2, extent 71,422 94.87,445.9
3D body: height 22, standoff -2, extent 110,422 133.87,445.9
3D body: height 22, standoff -2, extent 150,422 173.87,445.9
3D body: height 22, standoff -2, extent 189,422 212.87,445.9
3D body: height 22, standoff -2, extent 189,383 212.87,406.9
3D body: height 22, standoff -2, extent 150,383 173.87,406.9
3D body: height 22, standoff -2, extent 110,383 133.87,406.9
3D body: height 22, standoff -2, extent 71,383 94.87,406.9
3D body: height 22, standoff -2, extent -87,422 -63.13,445.9
3D body: height 22, standoff -2, extent -48,422 -24.13,445.9
3D body: height 22, standoff -2, extent -8,422 15.87,445.9
3D body: height 22, standoff -2, extent 31,422 54.87,445.9
3D body: height 22, standoff -2, extent 31,383 54.87,406.9
3D body: height 22, standoff -2, extent -8,383 15.87,406.9
3D body: height 22, standoff -2, extent -48,383 -24.13,406.9
3D body: height 22, standoff -2, extent -87,383 -63.13,406.9
3D body: height 22, standoff -2, extent -243,422 -219.13,445.9
3D body: height 22, standoff -2, extent -204,422 -180.13,445.9
3D body: height 22, standoff -2, extent -164,422 -140.13,445.9
3D body: height 22, standoff -2, extent -125,422 -101.13,445.9
3D body: height 22, standoff -2, extent -125,383 -101.13,406.9
3D body: height 22, standoff -2, extent -164,383 -140.13,406.9
3D body: height 22, standoff -2, extent -204,383 -180.13,406.9
3D body: height 22, standoff -2, extent -243,383 -219.13,406.9
3D body: height 22, standoff -2, extent -401,383 -377.13,406.9
3D body: height 22, standoff -2, extent -362,383 -338.13,406.9
3D body: height 22, standoff -2, extent -322,383 -298.13,406.9
3D body: height 22, standoff -2, extent -283,383 -259.13,406.9
3D body: height 22, standoff -2, extent -283,422 -259.13,445.9
3D body: height 22, standoff -2, extent -322,422 -298.13,445.9
3D body: height 22, standoff -2, extent -362,422 -338.13,445.9
3D body: height 22, standoff -2, extent -401,422 -377.13,445.9
3D body: height 30, standoff 16, extent -430,-432 477,475
3D body: height 45, standoff 30, extent -390,-393 436.94,433.95
3D body: height 31, standoff 30, extent -430,395 -350,475